# Altium footprint library PCB_LIB.PcbLib: 116 footprints (part 2 of 8)
Each footprint in its own frame and in the unit in brackets; x right, y up, seen from the top. Pads: shape width x height; smd on the part's side, far side on the other; paste and mask are expansions set on the pad; w line width, h text height; cw(c..) or ccw(c..) is an arc to the next point about the centre after c.
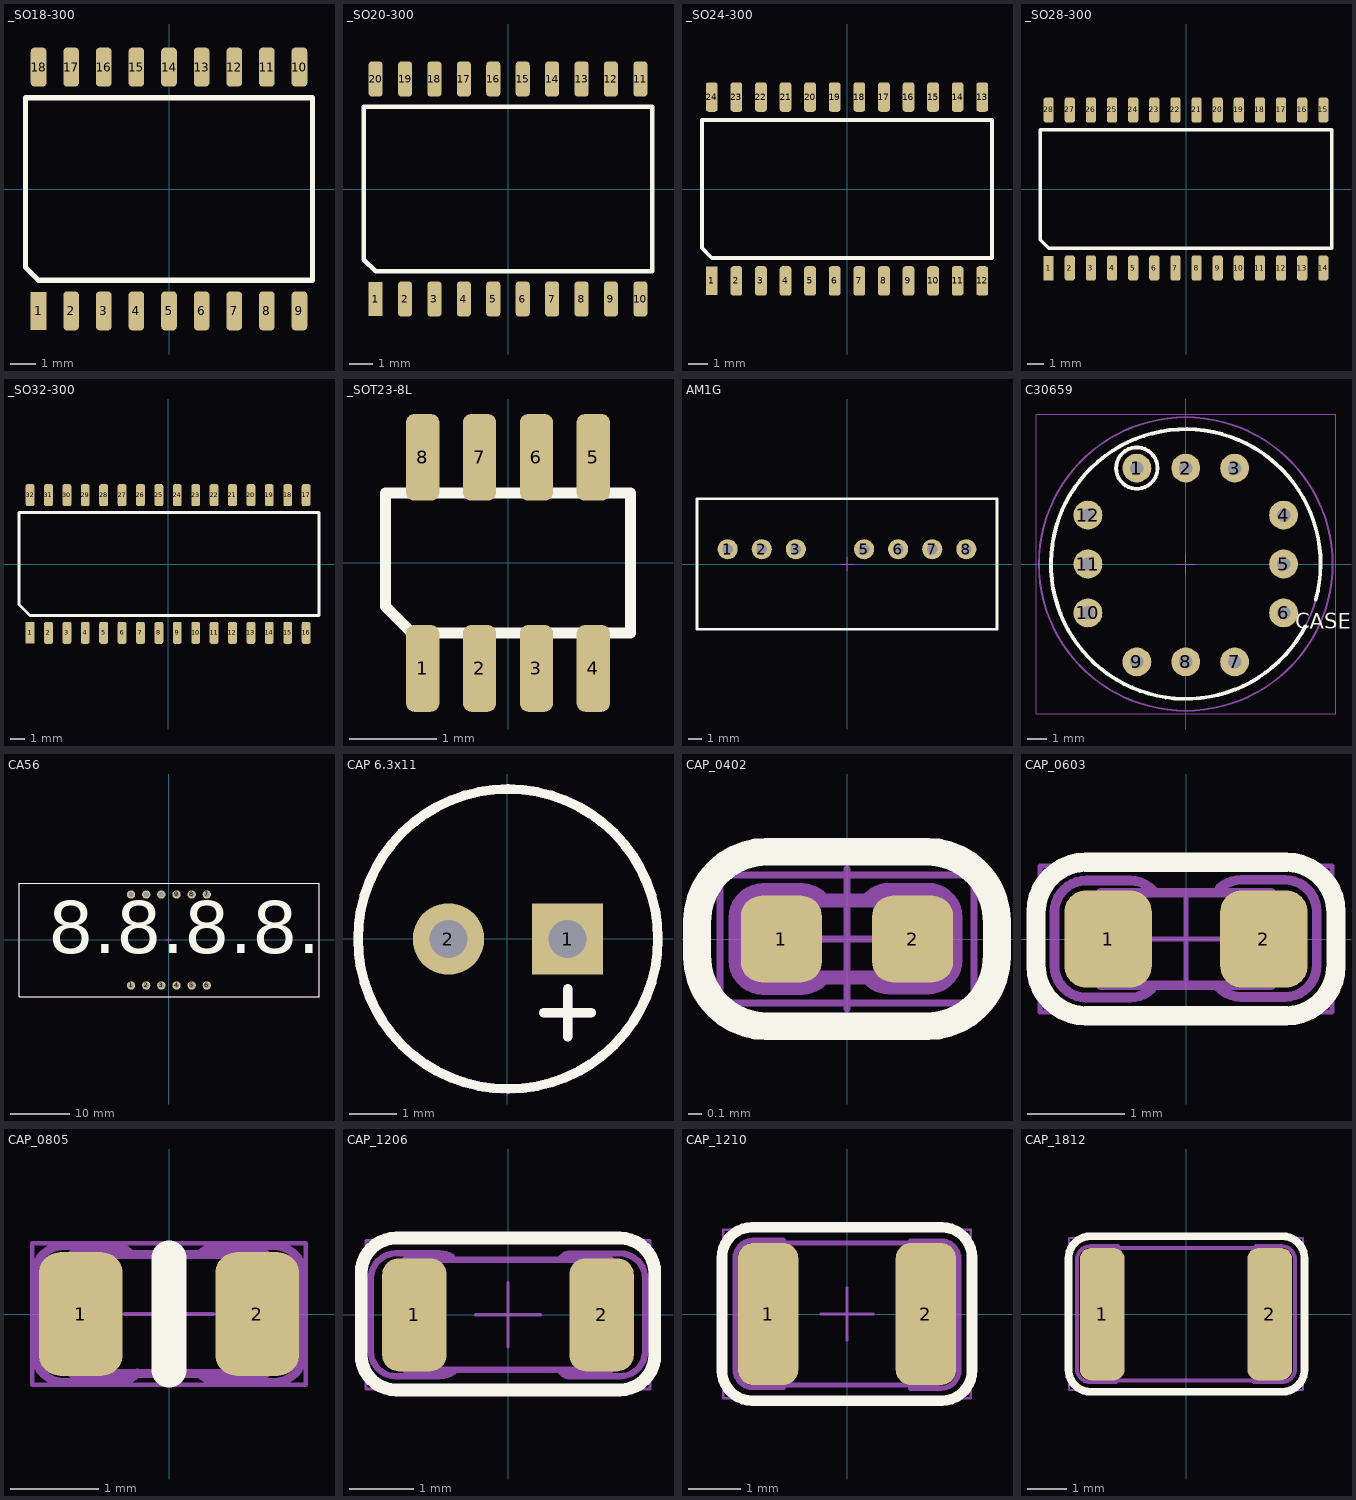
[diagram p1: the footprints below, top view; thin cyan lines are the x and y axes]

## _SO18-300 [mil]
pads (18):
  rect 24x58 smd mask+4: 1(-200,-187)
  rrect50% 24x60 smd mask+4: 2(-150,-187) 3(-100,-187) 4(-50,-187) 5(0,-187) 6(50,-187) 7(100,-187) 8(150,-187) 9(200,-187) 10(200,187) 11(150,187) 12(100,187) 13(50,187) 14(0,187) 15(-50,187) 16(-100,187) 17(-150,187) 18(-200,187)
Top Overlay:
  lines w8: -220,-120 -200,-140 220,-140 220,140 -220,140 -220,-120
3D body "SO18-300.STEP": height 67, standoff 0, extent -220,-209.5 220,209.5

## _SO20-300 [mil]
pads (20):
  rect 24x58 smd mask+4: 1(-225,-187)
  rrect50% 24x60 smd mask+4: 2(-175,-187) 3(-125,-187) 4(-75,-187) 5(-25,-187) 6(25,-187) 7(75,-187) 8(125,-187) 9(175,-187) 10(225,-187) 11(225,187) 12(175,187) 13(125,187) 14(75,187) 15(25,187) 16(-25,187) 17(-75,187) 18(-125,187) 19(-175,187) 20(-225,187)
Top Overlay:
  lines w8: -245,-120 -245,140 245,140 245,-140 -225,-140 -245,-120
3D body "SO20-300.STEP": height 67, standoff 0, extent -245,-209.5 245,209.5

## _SO24-300 [mil]
pads (24):
  rect 24x58 smd mask+4: 1(-275,-187)
  rrect50% 24x60 smd mask+4: 2(-225,-187) 3(-175,-187) 4(-125,-187) 5(-75,-187) 6(-25,-187) 7(25,-187) 8(75,-187) 9(125,-187) 10(175,-187) 11(225,-187) 12(275,-187) 13(275,187) 14(225,187) 15(175,187) 16(125,187) 17(75,187) 18(25,187) 19(-25,187) 20(-75,187) 21(-125,187) 22(-175,187) 23(-225,187) 24(-275,187)
Top Overlay:
  lines w8: -295,-120 -275,-140 295,-140 295,140 -295,140 -295,-120
3D body "SO24-300.STEP": height 67, standoff 0, extent -295,-209.5 295,209.5

## _SO28-300 [mil]
pads (28):
  rect 24x58 smd mask+4: 1(-325,-187)
  rrect50% 24x60 smd mask+4: 2(-275,-187) 3(-225,-187) 4(-175,-187) 5(-125,-187) 6(-75,-187) 7(-25,-187) 8(25,-187) 9(75,-187) 10(125,-187) 11(175,-187) 12(225,-187) 13(275,-187) 14(325,-187) 15(325,187) 16(275,187) 17(225,187) 18(175,187) 19(125,187) 20(75,187) 21(25,187) 22(-25,187) 23(-75,187) 24(-125,187) 25(-175,187) 26(-225,187) 27(-275,187) 28(-325,187)
Top Overlay:
  lines w8: -345,-120 -345,140 345,140 345,-140 -325,-140 -345,-120
3D body "SO28-300.STEP": height 67, standoff 0, extent -345,-209.5 345,209.5

## _SO32-300 [mil]
pads (32):
  rect 24x58 smd mask+4: 1(-375,-187)
  rrect50% 24x60 smd mask+4: 2(-325,-187) 3(-275,-187) 4(-225,-187) 5(-175,-187) 6(-125,-187) 7(-75,-187) 8(-25,-187) 9(25,-187) 10(75,-187) 11(125,-187) 12(175,-187) 13(225,-187) 14(275,-187) 15(325,-187) 16(375,-187) 17(375,187) 18(325,187) 19(275,187) 20(225,187) 21(175,187) 22(125,187) 23(75,187) 24(25,187) 25(-25,187) 26(-75,187) 27(-125,187) 28(-175,187) 29(-225,187) 30(-275,187) 31(-325,187) 32(-375,187)
Top Overlay:
  lines w8: -405,-110 -375,-140 410,-140 410,140 -405,140 -405,-110
3D body "SO32-300.STEP": height 108.95, standoff -1.17, extent -409.25,-202.3 409.25,202.31

## _SOT23-8L [mil] "SOT23, 8-Leads, Body 2.9x1.3mm, Pitch 0.95mm, Lead Span 2.5mm"
pads (8):
  rrect50% 15x39 smd mask-1000: 1(-38.39,-47.5) 2(-12.8,-47.5) 3(12.8,-47.5) 4(38.39,-47.5) 5(38.39,47.5) 6(12.8,47.5) 7(-12.8,47.5) 8(-38.39,47.5)
Top Overlay:
  lines w5: -55.12,-19.69 -55.12,31.5 55.12,31.5 55.12,-31.5 -43.31,-31.5 -55.12,-19.69
Top Solder:
  region: -29,-68 -29,-26 -51,-26 -51,-68
  lines w20: -39,34 -39,60 ; -13,-60 -13,-34 ; -13,34 -13,60 ; 13,-60 13,-34 ; 13,34 13,60 ; 39,-60 39,-34 ; 39,34 39,60

## AM1G [mm] "SIP-8 Package DC-DC Converter,Body 21.85x11.1mm, IZ Serie"
height 11.6
pads (7):
  round 1.5 hole 0.8: 1(-8.89,1.1) 2(-6.35,1.1) 3(-3.81,1.1) 5(1.27,1.1) 6(3.81,1.1) 7(6.35,1.1) 8(8.89,1.1)
Top Overlay:
  lines w0.2: -11.175,-4.85 11.175,-4.85 11.175,4.85 -11.175,4.85 -11.175,-4.85
Mechanical 14:
  lines w0.1: -11.175,-4.85 11.175,-4.85 11.175,4.85 -11.175,4.85 -11.175,-4.85
  text ".Comment" at -11.125,-3.5 h2
  text ".Designator" at -6.3,0.3 h3
Mechanical 15:
  lines w0.05: -0.5,0 0.5,0 ; 0,-0.5 0,0.5
  lines w0.1: -11.175,-4.85 -11.175,4.85 11.175,4.85 11.175,-4.85 -11.175,-4.85
3D body "DCDC_XPPOWER_IZ.stp": height 11.6, standoff -3.05, extent -11.175,-4.85 11.175,4.85

## C30659 [mm]
pads (12):
  round 1.5 hole 0.7: 1(-2.54,4.98) 2(0,4.98) 3(2.54,4.98) 4(5.08,2.54) 5(5.08,0) 6(5.08,-2.54) 7(2.54,-5.08) 8(0,-5.08) 9(-2.54,-5.08) 10(-5.08,-2.54) 11(-5.08,0) 12(-5.08,2.54)
Top Overlay:
  circle w0.2: c-2.54,4.98 r1.075
  lines w0.2: 6.21,-3.23 cw(c0,0) 6.75,-1.853
  text "CASE" at 5.675,-3.35 h0.8
Mechanical 13:
  circle w0.1: c2.54,4.985 r0.361
  circle w0.1: c-5.08,-2.54 r0.361
  circle w0.1: c-2.54,-5.08 r0.361
  circle w0.1: c0,-5.08 r0.361
  circle w0.1: c2.54,-5.08 r0.361
  circle w0.1: c5.08,-2.54 r0.361
  circle w0.1: c5.08,0 r0.361
  circle w0.1: c5.08,2.54 r0.361
  circle w0.1: c0,4.98 r0.361
  circle w0.1: c-2.54,4.98 r0.361
  circle w0.1: c-5.08,2.54 r0.361
  circle w0.1: c-5.08,0 r0.361
  circle w0.1: c0,0 r7.62
  circle w0.1: c0,0 r7
Mechanical 14:
  circle w0.1: c0,0 r7.623
  circle w0.1: c-2.54,4.98 r1.072
  text "1" at -2.75,4.375 h1.3
  text ".Designator" at -10.3,-1.95 h5
  text ".Comment" at -2.475,-8.975 h1.5
Mechanical 15:
  lines w0.05: -0.5,0 0.5,0 ; 0,-0.5 0,0.5 ; -7.775,-7.775 -7.775,0.1 -7.775,7.775 7.8,7.775 7.8,-7.775 -7.775,-7.775
3D body: height 6, standoff 0, extent 4.72,2.18 5.44,2.9
3D body: height 6, standoff 0, extent 2.18,4.625 2.9,5.345
3D body: height 6, standoff 0, extent 4.72,-2.9 5.44,-2.18
3D body: height 6, standoff 0, extent 4.72,-0.36 5.44,0.36
3D body: height 6, standoff 0, extent 2.18,-5.44 2.9,-4.72
3D body: height 6, standoff 0, extent -0.36,4.62 0.36,5.34
3D body: height 6, standoff 0, extent -2.9,4.62 -2.18,5.34
3D body: height 6, standoff 0, extent -5.44,2.18 -4.72,2.9
3D body: height 6, standoff 0, extent -0.36,-5.44 0.36,-4.72
3D body: height 6, standoff 0, extent -5.44,-0.36 -4.72,0.36
3D body: height 6, standoff 0, extent -2.9,-5.44 -2.18,-4.72
3D body: height 6, standoff 0, extent -5.44,-2.9 -4.72,-2.18
3D body: height 6.5, standoff 6, extent -7.619,-7.619 7.619,7.619
3D body: height 12, standoff 6.5, extent -6.999,-6.999 6.999,6.999

## CA56 [mm]
pads (12):
  round 1.4 hole 0.9: 1(-6.35,-7.62) 2(-3.81,-7.62) 3(-1.27,-7.62) 4(1.27,-7.62) 5(3.81,-7.62) 6(6.35,-7.62) 7(6.35,7.62) 8(3.81,7.62) 9(1.27,7.62) 10(-1.27,7.62) 11(-3.81,7.62) 12(-6.35,7.62)
Top Overlay:
  lines w0.2: -25.125,-9.5 25.15,-9.5 25.15,9.5 -25.125,9.5 -25.125,-9.5
  text "8.8.8.8." at -20.25,-5.175 h15
Mechanical 14:
  lines w0.1: -25.125,-9.5 -25.125,9.5 25.15,9.5 25.15,-9.5 -25.125,-9.5
  text "8.8.8.8." at -20.375,-5 h15
  text ".Designator" at -6.075,5.65 h3
  text ".Comment" at -4.475,-8.5 h3
Mechanical 15:
  lines w0.05: -0.5,0 0.5,0 ; 0,-0.5 0,0.5
  lines w0.1: -25.125,-9.5 -25.125,9.5 25.15,9.5 25.15,-9.5 -25.125,-9.5
3D body "end-el-san Co Ltd-King Bright CA56-12.step": height 8, standoff -4.1, extent -25.15,-9.5 25.15,9.5

## CAP 6.3x11 [mm] "Capacitor"
height 11
pads (2):
  rect 1.5x1.5 hole 0.8: 1(1.266,-0.001)
  round 1.5 hole 0.8: 2(-1.234,-0.001)
Top Overlay:
  circle w0.2: c0.016,0 r3.15
  lines w0.2: 0.766,-1.55 1.766,-1.55 ; 1.266,-2.05 1.266,-1.05
Mechanical 14:
  circle w0.2: c0.016,-0.001 r3.15
  lines w0.2: 0.766,-1.551 1.766,-1.551 ; 1.266,-2.051 1.266,-1.051
  text ".Designator" at -2.425,-0.475 h1.2
3D body "CAPPR250-630X1120.stp": height 11.2, standoff -3.6, extent -3.125,-3.125 3.175,3.175

## CAP_0402 [mm] "Chip Resistor, EIA 0402, Metric 1005, Body 1.0x0.5mm, IPC Medium Density"
height 0.4
pads (2):
  rrect50% 0.58x0.62 smd: 1(-0.47,0) 2(0.47,0)
Top Overlay:
  lines w0.2: -1.075,-0.125 ccw(c-0.575,-0.125) -0.575,-0.625 0.575,-0.625 ccw(c0.575,-0.125) 1.075,-0.125 1.075,0.125 ccw(c0.575,0.125) 0.575,0.625 -0.575,0.625 ccw(c-0.575,0.125) -1.075,0.125 -1.075,-0.125
Mechanical 14:
  lines w0.1: -0.171,-0.278 cw(c-0.325,-0.15) -0.325,-0.35 -0.6,-0.35 cw(c-0.6,-0.15) -0.8,-0.15 ; -0.171,0.278 ccw(c-0.325,0.15) -0.325,0.35 -0.6,0.35 ccw(c-0.6,0.15) -0.8,0.15 -0.8,-0.15 ; 0.15,-0.275 ccw(c0.304,-0.147) 0.304,-0.347 0.579,-0.347 ccw(c0.579,-0.147) 0.779,-0.147 0.779,0.153 ccw(c0.579,0.153) 0.579,0.353 0.304,0.353 ccw(c0.304,0.153) 0.15,0.281 ; -0.8,-0.15 -0.8,-0.15 ; -0.525,-0.275 0.525,-0.275 0.525,0.275 -0.525,0.275 -0.525,-0.275
  text ".Designator" at -0.8,-0.15 h0.4
  text ".Comment" at -0.508,-0.635 h0.3
Mechanical 15:
  lines w0.05: -0.5,0 0.5,0 ; 0,-0.5 0,0.5 ; -0.91,-0.46 -0.91,0.46 0.91,0.46 0.91,-0.46 -0.91,-0.46
3D body "CAPC1005X55N.stp": height 0.55, standoff 0, extent -0.525,-0.275 0.525,0.275

## CAP_0603 [mm] "Chip Resistor, EIA 0603, Metric 1608, Body 1.6x0.8mm, IPC Medium Density"
height 0.55
pads (2):
  rrect50% 0.9x1 smd: 1(-0.8,0) 2(0.8,0)
Top Overlay:
  lines w0.2: -1.54,-0.275 ccw(c-1.025,-0.275) -1.025,-0.79 1.025,-0.79 ccw(c1.025,-0.275) 1.54,-0.275 1.54,0.275 ccw(c1.025,0.275) 1.025,0.79 -1.025,0.79 ccw(c-1.025,0.275) -1.54,0.275 -1.54,-0.275
Mechanical 14:
  lines w0.1: -0.358,-0.519 cw(c-0.575,-0.275) -0.575,-0.601 ; -0.333,0.493 ccw(c-0.575,0.275) -0.575,0.601 -1.025,0.601 ccw(c-1.025,0.275) -1.351,0.275 -1.351,-0.275 ccw(c-1.025,-0.275) -1.025,-0.601 -0.575,-0.601 ; 0.324,-0.487 ccw(c0.567,-0.269) 0.567,-0.595 1.017,-0.595 ccw(c1.017,-0.269) 1.343,-0.269 1.343,0.281 ccw(c1.017,0.281) 1.017,0.607 0.567,0.607 ; 0.35,0.525 cw(c0.567,0.281) 0.567,0.607 ; -0.575,-0.601 -0.575,-0.601 ; 0.567,0.607 0.567,0.607 ; -0.875,-0.475 -0.875,0.475 0.875,0.475 0.875,-0.475 -0.875,-0.475
  text ".Designator" at -1.397,-0.127 h0.7
  text ".Comment" at -0.508,-0.381 h0.3
Mechanical 15:
  lines w0.05: -0.5,0 0.5,0 ; 0,-0.5 0,0.5 ; -1.5,-0.75 -1.5,0.75 1.5,0.75 1.5,-0.75 -1.5,-0.75
3D body "CAPC1608X85N.stp": height 0.85, standoff 0, extent -0.875,-0.475 0.875,0.475

## CAP_0805 [mm] "Chip Resistor, EIA 0805, Metric 2012, Body 2.0x1.2mm, IPC Medium Density"
height 0.6
pads (2):
  rrect50% 0.95x1.4 smd: 1(-1,0) 2(1,0)
Top Overlay:
  lines w0.4: 0,-0.635 0,0.635
Mechanical 14:
  lines w0.1: -0.635,0.775 cw(c-0.635,0.517) -0.429,0.672 ; -0.6,0.775 -1.187,0.775 ; -0.355,-0.67 cw(c-0.6,-0.437) -0.6,-0.775 ; 0.354,-0.672 ccw(c0.56,-0.517) 0.56,-0.775 1.187,-0.775 ccw(c1.187,-0.437) 1.525,-0.437 1.525,0.437 ccw(c1.187,0.437) 1.187,0.775 0.565,0.775 ccw(c0.565,0.509) 0.354,0.672 ; -1.525,0.437 cw(c-1.187,0.437) -1.187,0.775 ; -1.525,0.437 -1.525,0.437 ; -1.525,0.437 -1.525,-0.437 ccw(c-1.187,-0.437) -1.187,-0.775 -0.6,-0.775 ; -1.187,0.775 -1.187,0.775 ; -0.6,-0.775 -0.6,-0.775 ; -1.1,-0.675 -1.1,0.675 1.1,0.675 1.1,-0.675 -1.1,-0.675
  text ".Designator" at -1.2,-0.425 h0.6
Mechanical 15:
  lines w0.05: -0.5,0 0.5,0 ; 0,-0.5 0,0.5 ; -1.55,-0.8 -1.55,0.8 1.55,0.8 1.55,-0.8 -1.55,-0.8
3D body "CAPC2012X88N.stp": height 0.9, standoff 0, extent -1.05,-0.675 1.05,0.675

## CAP_1206 [mm] "Chip Resistor, EIA 1206, Metric 3016, Body 3.05x1.55mm, IPC Medium Density"
height 0.65
pads (2):
  rrect50% 1x1.75 smd: 1(-1.45,0) 2(1.45,0)
Top Overlay:
  lines w0.2: -1.736,1.189 ccw(c-1.736,1.189) -1.736,1.189 ; -1.736,1.189 ccw(c-1.736,0.65) -2.275,0.65 -2.275,-0.625 ccw(c-1.736,-0.625) -1.736,-1.164 1.736,-1.164 ccw(c1.736,-0.625) 2.275,-0.625 2.275,0.65 ccw(c1.736,0.65) 1.736,1.189 -1.736,1.189
Mechanical 14:
  lines w0.1: -2.127,0.562 -2.125,0.562 ; -1.738,0.95 ccw(c-1.738,0.562) -2.125,0.562 ; -1.738,0.952 -1.063,0.952 cw(c-1.063,0.563) -0.868,0.9 ; -0.832,-0.874 cw(c-1.062,-0.562) -1.062,-0.95 -1.062,-0.952 -1.737,-0.952 cw(c-1.737,-0.563) -2.127,-0.563 -2.125,-0.563 -2.125,0.562 ; 0.821,-0.883 ccw(c0.971,-0.759) 0.971,-0.954 1.738,-0.954 ; 0.836,0.89 cw(c0.97,0.769) 0.97,0.95 1.737,0.95 cw(c1.737,0.561) 2.127,0.561 ; 1.738,-0.952 ccw(c1.738,-0.564) 2.125,-0.564 2.125,0.561 ; -1.6,-0.85 1.6,-0.85 1.6,0.85 -1.6,0.85 -1.6,-0.85
  text ".Comment" at -0.889,-0.635 h0.6
  text ".Designator" at -2.413,-0.127 h1.2
Mechanical 15:
  lines w0.05: -0.5,0 0.5,0 ; 0,-0.5 0,0.5 ; -2.2,-1.15 -2.2,1.15 2.2,1.15 2.2,-1.15 -2.2,-1.15
3D body "CAPC3216X130N.stp": height 1.3, standoff 0, extent -1.7,-0.9 1.7,0.9

## CAP_1210 [mm] "Chip Resistor, EIA 1210, Metric 3225, Body 3.2x2.5mm, IPC Medium Density"
height 0.7
pads (2):
  rrect50% 1.15x2.7 smd: 1(-1.5,0) 2(1.5,0)
Top Overlay:
  lines w0.2: -2.375,-1.1 -2.375,1.075 cw(c-1.804,1.075) -1.804,1.646 1.804,1.646 cw(c1.804,1.075) 2.375,1.075 ; -2.375,-1.075 ccw(c-1.804,-1.075) -1.804,-1.646 1.804,-1.646 ccw(c1.804,-1.075) 2.375,-1.075 2.375,1.1
Mechanical 14:
  lines w0.1: -1.212,-1.398 -1.787,-1.398 cw(c-1.787,-1.06) -2.125,-1.06 ; -1.213,1.4 -1.787,1.4 ccw(c-1.787,1.062) -2.125,1.062 -2.125,-1.06 ; 1.213,-1.41 1.787,-1.41 ccw(c1.787,-1.072) 2.125,-1.072 2.125,1.05 ccw(c1.787,1.05) 1.787,1.388 1.212,1.388 ; -2.125,-1.06 -2.125,-1.06 ; -1.7,-1.35 1.7,-1.35 1.7,1.35 -1.7,1.35 -1.7,-1.35
  text ".Designator" at -3.175,-0.127 h1.52
  text ".Comment" at -1.016,-1.016 h0.6
Mechanical 15:
  lines w0.05: -0.5,0 0.5,0 ; 0,-0.5 0,0.5 ; -2.35,-1.6 -2.35,1.6 2.35,1.6 2.35,-1.6 -2.35,-1.6
3D body "CAPC3225X140N.stp": height 1.4, standoff 0, extent -1.7,-1.35 1.7,1.35

## CAP_1812 [mm] "Chip Resistor, EIA 1812, Metric 4532, 2-Leads, Body 4.5x3.2mm, IPC Medium Density"
height 0.7
pads (2):
  rrect50% 1.15x3.4 smd: 1(-2.15,0) 2(2.15,0)
Top Overlay:
  lines w0.2: -3.016,-1.425 ccw(c-2.45,-1.425) -2.45,-1.991 2.475,-1.991 ccw(c2.475,-1.425) 3.041,-1.425 3.041,1.434 ccw(c2.475,1.434) 2.475,2 -2.45,2 ccw(c-2.45,1.434) -3.016,1.434 -3.016,-1.425
Mechanical 14:
  lines w0.1: -1.8,-1.748 -2.45,-1.748 cw(c-2.45,-1.4) -2.798,-1.4 ; -1.75,1.748 -2.45,1.748 ccw(c-2.45,1.4) -2.798,1.4 -2.798,-1.4 ; 1.75,-1.748 2.45,-1.748 ccw(c2.45,-1.4) 2.798,-1.4 2.798,1.4 ccw(c2.45,1.4) 2.45,1.748 1.8,1.748 ; -2.798,-1.4 -2.798,-1.4 ; -2.375,-1.7 2.375,-1.7 2.375,1.7 -2.375,1.7 -2.375,-1.7
  text ".Comment" at -1.524,-1.524 h0.9
  text ".Designator" at -4.445,-0.254 h2.2
Mechanical 15:
  lines w0.05: -3,-1.95 3,-1.95 3,1.95 -3,1.95 -3,-1.95
3D body "CAPC4532X218N.stp": height 2.18, standoff 0, extent -2.375,-1.7 2.375,1.7